# Altium schematic symbol library jlcpcb_2025_04_capacitors_extended_0201.schlib: 1175 symbols (part 2 of 7) (continued)
## C0603X7R471KGT
designator C?  Capacitance: 470pF  (hidden comment: *)
Capacitor, Ceramic (MLCC), 470pF, ±10%, 50V, X7R, ±10%, SMD 0201; Manufacturer: Darfon Elec; Manufacturer Part Number: C0603X7R471KGT; Package Size: 0201; JLCPCB Basic Part: No; JLCPCB Part Number: C258476; Supplier 1: LCSC; Category: Capacitors - MLCC; Supplier Part Number 1: C258476; Tolerance: ±10%; Voltage Rating: 50V; Temperature Coefficient: X7R; RoHS: Yes; ComponentLink1Description: Datasheet; ComponentLink1URL: https://wmsc.lcsc.com/wmsc/upload/file/pdf/v2/lcsc/2304140030_Darfon-Elec-C0603X7R471KGT_C258476.pdf; ComponentLink2Description: JLCPCB Part URL; ComponentLink2URL: https://jlcpcb.com/partdetail/C258476; ComponentLink3Description: LCSC Part URL; ComponentLink3URL: https://lcsc.com/product-detail/Multilayer-Ceramic-Capacitors-MLCC---SMD-SMT_Darfon-Elec-Darfon-Elec-C0603X7R471KGT_C258476.html
footprint CAP-0201 (0201 (0603M) Capacitor)
pins: 1, 2

## C0603X7R472KDTS
designator C?  Capacitance: 4.7nF  (hidden comment: *)
Capacitor, Ceramic (MLCC), 4.7nF, ±10%, 10V, X7R, ±10%, SMD 0201; Manufacturer: Darfon Elec; Manufacturer Part Number: C0603X7R472KDTS; Package Size: 0201; JLCPCB Basic Part: No; JLCPCB Part Number: C258478; Supplier 1: LCSC; Category: Capacitors - MLCC; Supplier Part Number 1: C258478; Tolerance: ±10%; Voltage Rating: 10V; Temperature Coefficient: X7R; RoHS: Yes; ComponentLink1Description: Datasheet; ComponentLink1URL: https://wmsc.lcsc.com/wmsc/upload/file/pdf/v2/lcsc/2304140030_Darfon-Elec-C0603X7R472KDTS_C258478.pdf; ComponentLink2Description: JLCPCB Part URL; ComponentLink2URL: https://jlcpcb.com/partdetail/C258478; ComponentLink3Description: LCSC Part URL; ComponentLink3URL: https://lcsc.com/product-detail/Multilayer-Ceramic-Capacitors-MLCC---SMD-SMT_Darfon-Elec-Darfon-Elec-C0603X7R472KDTS_C258478.html
footprint CAP-0201 (0201 (0603M) Capacitor)
pins: 1, 2

## C0603X7R681KGTS
designator C?  Capacitance: 680pF  (hidden comment: *)
Capacitor, Ceramic (MLCC), 680pF, ±10%, 50V, X7R, ±10%, SMD 0201; Manufacturer: Darfon Elec; Manufacturer Part Number: C0603X7R681KGTS; Package Size: 0201; JLCPCB Basic Part: No; JLCPCB Part Number: C311865; Supplier 1: LCSC; Category: Capacitors - MLCC; Supplier Part Number 1: C311865; Tolerance: ±10%; Voltage Rating: 50V; Temperature Coefficient: X7R; RoHS: Yes; ComponentLink1Description: Datasheet; ComponentLink1URL: https://wmsc.lcsc.com/wmsc/upload/file/pdf/v2/lcsc/2304140030_Darfon-Elec-C0603X7R681KGTS_C311865.pdf; ComponentLink2Description: JLCPCB Part URL; ComponentLink2URL: https://jlcpcb.com/partdetail/C311865; ComponentLink3Description: LCSC Part URL; ComponentLink3URL: https://lcsc.com/product-detail/Multilayer-Ceramic-Capacitors-MLCC---SMD-SMT_Darfon-Elec-Darfon-Elec-C0603X7R681KGTS_C311865.html
footprint CAP-0201 (0201 (0603M) Capacitor)
pins: 1, 2

## C0603X7R682KDTS
designator C?  Capacitance: 6.8nF  (hidden comment: *)
Capacitor, Ceramic (MLCC), 6.8nF, ±10%, 10V, X7R, ±10%, SMD 0201; Manufacturer: Darfon Elec; Manufacturer Part Number: C0603X7R682KDTS; Package Size: 0201; JLCPCB Basic Part: No; JLCPCB Part Number: C311863; Supplier 1: LCSC; Category: Capacitors - MLCC; Supplier Part Number 1: C311863; Tolerance: ±10%; Voltage Rating: 10V; Temperature Coefficient: X7R; RoHS: Yes; ComponentLink1Description: Datasheet; ComponentLink1URL: https://wmsc.lcsc.com/wmsc/upload/file/pdf/v2/lcsc/2304140030_Darfon-Elec-C0603X7R682KDTS_C311863.pdf; ComponentLink2Description: JLCPCB Part URL; ComponentLink2URL: https://jlcpcb.com/partdetail/C311863; ComponentLink3Description: LCSC Part URL; ComponentLink3URL: https://lcsc.com/product-detail/Multilayer-Ceramic-Capacitors-MLCC---SMD-SMT_Darfon-Elec-Darfon-Elec-C0603X7R682KDTS_C311863.html
footprint CAP-0201 (0201 (0603M) Capacitor)
pins: 1, 2

## C0603X7S1A104KT00NE
designator C?  Capacitance: 100nF  (hidden comment: *)
Capacitor, Ceramic (MLCC), 100nF, ±10%, 10V, X7S, ±10%, SMD 0201; Manufacturer: TDK; Manufacturer Part Number: C0603X7S1A104KT00NE; Package Size: 0201; JLCPCB Basic Part: No; JLCPCB Part Number: C445752; Supplier 1: LCSC; Category: Capacitors - MLCC; Supplier Part Number 1: C445752; Tolerance: ±10%; Voltage Rating: 10V; Temperature Coefficient: X7S; RoHS: Yes; ComponentLink1Description: Datasheet; ComponentLink1URL: https://wmsc.lcsc.com/wmsc/upload/file/pdf/v2/lcsc/2304140030_TDK-C0603X7S1A104KT00NE_C445752.pdf; ComponentLink2Description: JLCPCB Part URL; ComponentLink2URL: https://jlcpcb.com/partdetail/C445752; ComponentLink3Description: LCSC Part URL; ComponentLink3URL: https://lcsc.com/product-detail/Multilayer-Ceramic-Capacitors-MLCC---SMD-SMT_TDK-TDK-C0603X7S1A104KT00NE_C445752.html
footprint CAP-0201 (0201 (0603M) Capacitor)
pins: 1, 2

## CC0201BRNPO9BN1R2
designator C?  Capacitance: 1.2pF  (hidden comment: *)
Capacitor, Ceramic (MLCC), 1.2pF, 50V, NP0, SMD 0201; Manufacturer: YAGEO; Manufacturer Part Number: CC0201BRNPO9BN1R2; Package Size: 0201; JLCPCB Basic Part: No; JLCPCB Part Number: C326704; Supplier 1: LCSC; Category: Capacitors - MLCC; Supplier Part Number 1: C326704; Voltage Rating: 50V; Temperature Coefficient: NP0; RoHS: Yes; ComponentLink1Description: Datasheet; ComponentLink1URL: https://wmsc.lcsc.com/wmsc/upload/file/pdf/v2/lcsc/1811151646_YAGEO-CC0201BRNPO9BN1R2_C326704.pdf; ComponentLink2Description: JLCPCB Part URL; ComponentLink2URL: https://jlcpcb.com/partdetail/C326704; ComponentLink3Description: LCSC Part URL; ComponentLink3URL: https://lcsc.com/product-detail/Multilayer-Ceramic-Capacitors-MLCC---SMD-SMT_YAGEO-YAGEO-CC0201BRNPO9BN1R2_C326704.html
footprint CAP-0201 (0201 (0603M) Capacitor)
pins: 1, 2

## CC0201BRNPO9BN1R4
designator C?  Capacitance: 1.4pF  (hidden comment: *)
Capacitor, Ceramic (MLCC), 1.4pF, 50V, NP0, SMD 0201; Manufacturer: YAGEO; Manufacturer Part Number: CC0201BRNPO9BN1R4; Package Size: 0201; JLCPCB Basic Part: No; JLCPCB Part Number: C2930547; Supplier 1: LCSC; Category: Capacitors - MLCC; Supplier Part Number 1: C2930547; Voltage Rating: 50V; Temperature Coefficient: NP0; RoHS: Yes; ComponentLink1Description: Datasheet; ComponentLink1URL: https://wmsc.lcsc.com/wmsc/upload/file/pdf/v2/lcsc/2201121500_YAGEO-CC0201BRNPO9BN1R4_C2930547.pdf; ComponentLink2Description: JLCPCB Part URL; ComponentLink2URL: https://jlcpcb.com/partdetail/C2930547; ComponentLink3Description: LCSC Part URL; ComponentLink3URL: https://lcsc.com/product-detail/Multilayer-Ceramic-Capacitors-MLCC---SMD-SMT_YAGEO-YAGEO-CC0201BRNPO9BN1R4_C2930547.html
footprint CAP-0201 (0201 (0603M) Capacitor)
pins: 1, 2

## CC0201BRNPO9BN2R0
designator C?  Capacitance: 2pF  (hidden comment: *)
Capacitor, Ceramic (MLCC), 2pF, 50V, NP0, SMD 0201; Manufacturer: YAGEO; Manufacturer Part Number: CC0201BRNPO9BN2R0; Package Size: 0201; JLCPCB Basic Part: No; JLCPCB Part Number: C505489; Supplier 1: LCSC; Category: Capacitors - MLCC; Supplier Part Number 1: C505489; Voltage Rating: 50V; Temperature Coefficient: NP0; RoHS: Yes; ComponentLink1Description: Datasheet; ComponentLink1URL: https://wmsc.lcsc.com/wmsc/upload/file/pdf/v2/lcsc/2304140030_YAGEO-CC0201BRNPO9BN2R0_C505489.pdf; ComponentLink2Description: JLCPCB Part URL; ComponentLink2URL: https://jlcpcb.com/partdetail/C505489; ComponentLink3Description: LCSC Part URL; ComponentLink3URL: https://lcsc.com/product-detail/Multilayer-Ceramic-Capacitors-MLCC---SMD-SMT_YAGEO-YAGEO-CC0201BRNPO9BN2R0_C505489.html
footprint CAP-0201 (0201 (0603M) Capacitor)
pins: 1, 2

## CC0201BRNPO9BN2R4
designator C?  Capacitance: 2.4pF  (hidden comment: *)
Capacitor, Ceramic (MLCC), 2.4pF, 50V, NP0, SMD 0201; Manufacturer: YAGEO; Manufacturer Part Number: CC0201BRNPO9BN2R4; Package Size: 0201; JLCPCB Basic Part: No; JLCPCB Part Number: C576676; Supplier 1: LCSC; Category: Capacitors - MLCC; Supplier Part Number 1: C576676; Voltage Rating: 50V; Temperature Coefficient: NP0; RoHS: Yes; ComponentLink1Description: Datasheet; ComponentLink1URL: https://wmsc.lcsc.com/wmsc/upload/file/pdf/v2/lcsc/2201131030_YAGEO-CC0201BRNPO9BN2R4_C576676.pdf; ComponentLink2Description: JLCPCB Part URL; ComponentLink2URL: https://jlcpcb.com/partdetail/C576676; ComponentLink3Description: LCSC Part URL; ComponentLink3URL: https://lcsc.com/product-detail/Multilayer-Ceramic-Capacitors-MLCC---SMD-SMT_YAGEO-YAGEO-CC0201BRNPO9BN2R4_C576676.html
footprint CAP-0201 (0201 (0603M) Capacitor)
pins: 1, 2

## CC0201BRNPO9BN2R7
designator C?  Capacitance: 2.7pF  (hidden comment: *)
Capacitor, Ceramic (MLCC), 2.7pF, 50V, NP0, SMD 0201; Manufacturer: YAGEO; Manufacturer Part Number: CC0201BRNPO9BN2R7; Package Size: 0201; JLCPCB Basic Part: No; JLCPCB Part Number: C505475; Supplier 1: LCSC; Category: Capacitors - MLCC; Supplier Part Number 1: C505475; Voltage Rating: 50V; Temperature Coefficient: NP0; RoHS: Yes; ComponentLink1Description: Datasheet; ComponentLink1URL: https://wmsc.lcsc.com/wmsc/upload/file/pdf/v2/lcsc/2304140030_YAGEO-CC0201BRNPO9BN2R7_C505475.pdf; ComponentLink2Description: JLCPCB Part URL; ComponentLink2URL: https://jlcpcb.com/partdetail/C505475; ComponentLink3Description: LCSC Part URL; ComponentLink3URL: https://lcsc.com/product-detail/Multilayer-Ceramic-Capacitors-MLCC---SMD-SMT_YAGEO-YAGEO-CC0201BRNPO9BN2R7_C505475.html
footprint CAP-0201 (0201 (0603M) Capacitor)
pins: 1, 2

## CC0201BRNPO9BN3R3
designator C?  Capacitance: 3.3pF  (hidden comment: *)
Capacitor, Ceramic (MLCC), 3.3pF, 50V, NP0, SMD 0201; Manufacturer: YAGEO; Manufacturer Part Number: CC0201BRNPO9BN3R3; Package Size: 0201; JLCPCB Basic Part: No; JLCPCB Part Number: C505487; Supplier 1: LCSC; Category: Capacitors - MLCC; Supplier Part Number 1: C505487; Voltage Rating: 50V; Temperature Coefficient: NP0; RoHS: Yes; ComponentLink1Description: Datasheet; ComponentLink1URL: https://wmsc.lcsc.com/wmsc/upload/file/pdf/v2/lcsc/2304140030_YAGEO-CC0201BRNPO9BN3R3_C505487.pdf; ComponentLink2Description: JLCPCB Part URL; ComponentLink2URL: https://jlcpcb.com/partdetail/C505487; ComponentLink3Description: LCSC Part URL; ComponentLink3URL: https://lcsc.com/product-detail/Multilayer-Ceramic-Capacitors-MLCC---SMD-SMT_YAGEO-YAGEO-CC0201BRNPO9BN3R3_C505487.html
footprint CAP-0201 (0201 (0603M) Capacitor)
pins: 1, 2

## CC0201BRNPO9BN3R6
designator C?  Capacitance: 3.6pF  (hidden comment: *)
Capacitor, Ceramic (MLCC), 3.6pF, 50V, NP0, SMD 0201; Manufacturer: YAGEO; Manufacturer Part Number: CC0201BRNPO9BN3R6; Package Size: 0201; JLCPCB Basic Part: No; JLCPCB Part Number: C576677; Supplier 1: LCSC; Category: Capacitors - MLCC; Supplier Part Number 1: C576677; Voltage Rating: 50V; Temperature Coefficient: NP0; RoHS: Yes; ComponentLink1Description: Datasheet; ComponentLink1URL: https://wmsc.lcsc.com/wmsc/upload/file/pdf/v2/lcsc/2009261808_YAGEO-CC0201BRNPO9BN3R6_C576677.pdf; ComponentLink2Description: JLCPCB Part URL; ComponentLink2URL: https://jlcpcb.com/partdetail/C576677; ComponentLink3Description: LCSC Part URL; ComponentLink3URL: https://lcsc.com/product-detail/Multilayer-Ceramic-Capacitors-MLCC---SMD-SMT_YAGEO-YAGEO-CC0201BRNPO9BN3R6_C576677.html
footprint CAP-0201 (0201 (0603M) Capacitor)
pins: 1, 2

## CC0201BRNPO9BN3R9
designator C?  Capacitance: 3.9pF  (hidden comment: *)
Capacitor, Ceramic (MLCC), 3.9pF, 50V, NP0, SMD 0201; Manufacturer: YAGEO; Manufacturer Part Number: CC0201BRNPO9BN3R9; Package Size: 0201; JLCPCB Basic Part: No; JLCPCB Part Number: C505485; Supplier 1: LCSC; Category: Capacitors - MLCC; Supplier Part Number 1: C505485; Voltage Rating: 50V; Temperature Coefficient: NP0; RoHS: Yes; ComponentLink1Description: Datasheet; ComponentLink1URL: https://wmsc.lcsc.com/wmsc/upload/file/pdf/v2/lcsc/2304140030_YAGEO-CC0201BRNPO9BN3R9_C505485.pdf; ComponentLink2Description: JLCPCB Part URL; ComponentLink2URL: https://jlcpcb.com/partdetail/C505485; ComponentLink3Description: LCSC Part URL; ComponentLink3URL: https://lcsc.com/product-detail/Multilayer-Ceramic-Capacitors-MLCC---SMD-SMT_YAGEO-YAGEO-CC0201BRNPO9BN3R9_C505485.html
footprint CAP-0201 (0201 (0603M) Capacitor)
pins: 1, 2

## CC0201BRNPO9BN4R7
designator C?  Capacitance: 4.7pF  (hidden comment: *)
Capacitor, Ceramic (MLCC), 4.7pF, 50V, NP0, SMD 0201; Manufacturer: YAGEO; Manufacturer Part Number: CC0201BRNPO9BN4R7; Package Size: 0201; JLCPCB Basic Part: No; JLCPCB Part Number: C505471; Supplier 1: LCSC; Category: Capacitors - MLCC; Supplier Part Number 1: C505471; Voltage Rating: 50V; Temperature Coefficient: NP0; RoHS: Yes; ComponentLink1Description: Datasheet; ComponentLink1URL: https://wmsc.lcsc.com/wmsc/upload/file/pdf/v2/lcsc/2304140030_YAGEO-CC0201BRNPO9BN4R7_C505471.pdf; ComponentLink2Description: JLCPCB Part URL; ComponentLink2URL: https://jlcpcb.com/partdetail/C505471; ComponentLink3Description: LCSC Part URL; ComponentLink3URL: https://lcsc.com/product-detail/Multilayer-Ceramic-Capacitors-MLCC---SMD-SMT_YAGEO-YAGEO-CC0201BRNPO9BN4R7_C505471.html
footprint CAP-0201 (0201 (0603M) Capacitor)
pins: 1, 2

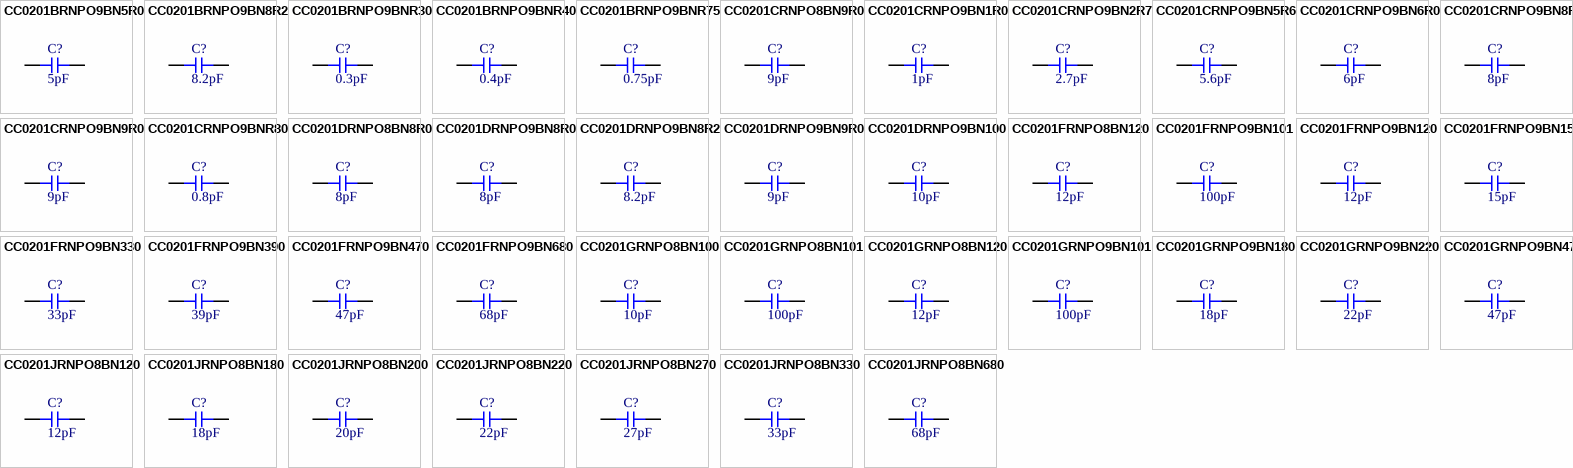
[diagram p6: symbols CC0201BRNPO9BN5R0 to CC0201JRNPO8BN680]

## CC0201BRNPO9BN5R0
designator C?  Capacitance: 5pF  (hidden comment: *)
Capacitor, Ceramic (MLCC), 5pF, 50V, NP0, SMD 0201; Manufacturer: YAGEO; Manufacturer Part Number: CC0201BRNPO9BN5R0; Package Size: 0201; JLCPCB Basic Part: No; JLCPCB Part Number: C576680; Supplier 1: LCSC; Category: Capacitors - MLCC; Supplier Part Number 1: C576680; Voltage Rating: 50V; Temperature Coefficient: NP0; RoHS: Yes; ComponentLink1Description: Datasheet; ComponentLink1URL: https://wmsc.lcsc.com/wmsc/upload/file/pdf/v2/lcsc/2203081130_YAGEO-CC0201BRNPO9BN5R0_C576680.pdf; ComponentLink2Description: JLCPCB Part URL; ComponentLink2URL: https://jlcpcb.com/partdetail/C576680; ComponentLink3Description: LCSC Part URL; ComponentLink3URL: https://lcsc.com/product-detail/Multilayer-Ceramic-Capacitors-MLCC---SMD-SMT_YAGEO-YAGEO-CC0201BRNPO9BN5R0_C576680.html
footprint CAP-0201 (0201 (0603M) Capacitor)
pins: 1, 2

## CC0201BRNPO9BN8R2
designator C?  Capacitance: 8.2pF  (hidden comment: *)
Capacitor, Ceramic (MLCC), 8.2pF, 50V, NP0, SMD 0201; Manufacturer: YAGEO; Manufacturer Part Number: CC0201BRNPO9BN8R2; Package Size: 0201; JLCPCB Basic Part: No; JLCPCB Part Number: C505501; Supplier 1: LCSC; Category: Capacitors - MLCC; Supplier Part Number 1: C505501; Voltage Rating: 50V; Temperature Coefficient: NP0; RoHS: Yes; ComponentLink1Description: Datasheet; ComponentLink1URL: https://wmsc.lcsc.com/wmsc/upload/file/pdf/v2/lcsc/2304140030_YAGEO-CC0201BRNPO9BN8R2_C505501.pdf; ComponentLink2Description: JLCPCB Part URL; ComponentLink2URL: https://jlcpcb.com/partdetail/C505501; ComponentLink3Description: LCSC Part URL; ComponentLink3URL: https://lcsc.com/product-detail/Multilayer-Ceramic-Capacitors-MLCC---SMD-SMT_YAGEO-YAGEO-CC0201BRNPO9BN8R2_C505501.html
footprint CAP-0201 (0201 (0603M) Capacitor)
pins: 1, 2

## CC0201BRNPO9BNR30
designator C?  Capacitance: 0.3pF  (hidden comment: *)
Capacitor, Ceramic (MLCC), 0.3pF, 50V, NP0, SMD 0201; Manufacturer: YAGEO; Manufacturer Part Number: CC0201BRNPO9BNR30; Package Size: 0201; JLCPCB Basic Part: No; JLCPCB Part Number: C309450; Supplier 1: LCSC; Category: Capacitors - MLCC; Supplier Part Number 1: C309450; Voltage Rating: 50V; Temperature Coefficient: NP0; RoHS: Yes; ComponentLink1Description: Datasheet; ComponentLink1URL: https://wmsc.lcsc.com/wmsc/upload/file/pdf/v2/lcsc/2304140030_YAGEO-CC0201BRNPO9BNR30_C309450.pdf; ComponentLink2Description: JLCPCB Part URL; ComponentLink2URL: https://jlcpcb.com/partdetail/C309450; ComponentLink3Description: LCSC Part URL; ComponentLink3URL: https://lcsc.com/product-detail/Multilayer-Ceramic-Capacitors-MLCC---SMD-SMT_YAGEO-YAGEO-CC0201BRNPO9BNR30_C309450.html
footprint CAP-0201 (0201 (0603M) Capacitor)
pins: 1, 2

## CC0201BRNPO9BNR40
designator C?  Capacitance: 0.4pF  (hidden comment: *)
Capacitor, Ceramic (MLCC), 0.4pF, 50V, NP0, SMD 0201; Manufacturer: YAGEO; Manufacturer Part Number: CC0201BRNPO9BNR40; Package Size: 0201; JLCPCB Basic Part: No; JLCPCB Part Number: C576683; Supplier 1: LCSC; Category: Capacitors - MLCC; Supplier Part Number 1: C576683; Voltage Rating: 50V; Temperature Coefficient: NP0; RoHS: Yes; ComponentLink1Description: Datasheet; ComponentLink1URL: https://wmsc.lcsc.com/wmsc/upload/file/pdf/v2/lcsc/2112151830_YAGEO-CC0201BRNPO9BNR40_C576683.pdf; ComponentLink2Description: JLCPCB Part URL; ComponentLink2URL: https://jlcpcb.com/partdetail/C576683; ComponentLink3Description: LCSC Part URL; ComponentLink3URL: https://lcsc.com/product-detail/Multilayer-Ceramic-Capacitors-MLCC---SMD-SMT_YAGEO-YAGEO-CC0201BRNPO9BNR40_C576683.html
footprint CAP-0201 (0201 (0603M) Capacitor)
pins: 1, 2

## CC0201BRNPO9BNR75
designator C?  Capacitance: 0.75pF  (hidden comment: *)
Capacitor, Ceramic (MLCC), 0.75pF, 50V, NP0, SMD 0201; Manufacturer: YAGEO; Manufacturer Part Number: CC0201BRNPO9BNR75; Package Size: 0201; JLCPCB Basic Part: No; JLCPCB Part Number: C505469; Supplier 1: LCSC; Category: Capacitors - MLCC; Supplier Part Number 1: C505469; Voltage Rating: 50V; Temperature Coefficient: NP0; RoHS: Yes; ComponentLink1Description: Datasheet; ComponentLink1URL: https://wmsc.lcsc.com/wmsc/upload/file/pdf/v2/lcsc/2304140030_YAGEO-CC0201BRNPO9BNR75_C505469.pdf; ComponentLink2Description: JLCPCB Part URL; ComponentLink2URL: https://jlcpcb.com/partdetail/C505469; ComponentLink3Description: LCSC Part URL; ComponentLink3URL: https://lcsc.com/product-detail/Multilayer-Ceramic-Capacitors-MLCC---SMD-SMT_YAGEO-YAGEO-CC0201BRNPO9BNR75_C505469.html
footprint CAP-0201 (0201 (0603M) Capacitor)
pins: 1, 2

## CC0201CRNPO8BN9R0
designator C?  Capacitance: 9pF  (hidden comment: *)
Capacitor, Ceramic (MLCC), 9pF, 25V, NP0, SMD 0201; Manufacturer: YAGEO; Manufacturer Part Number: CC0201CRNPO8BN9R0; Package Size: 0201; JLCPCB Basic Part: No; JLCPCB Part Number: C1852874; Supplier 1: LCSC; Category: Capacitors - MLCC; Supplier Part Number 1: C1852874; Voltage Rating: 25V; Temperature Coefficient: NP0; RoHS: Yes; ComponentLink1Description: Datasheet; ComponentLink1URL: https://wmsc.lcsc.com/wmsc/upload/file/pdf/v2/lcsc/2202151130_YAGEO-CC0201CRNPO8BN9R0_C1852874.pdf; ComponentLink2Description: JLCPCB Part URL; ComponentLink2URL: https://jlcpcb.com/partdetail/C1852874; ComponentLink3Description: LCSC Part URL; ComponentLink3URL: https://lcsc.com/product-detail/Multilayer-Ceramic-Capacitors-MLCC---SMD-SMT_YAGEO-YAGEO-CC0201CRNPO8BN9R0_C1852874.html
footprint CAP-0201 (0201 (0603M) Capacitor)
pins: 1, 2

## CC0201CRNPO9BN1R0
designator C?  Capacitance: 1pF  (hidden comment: *)
Capacitor, Ceramic (MLCC), 1pF, 50V, NP0, SMD 0201; Manufacturer: YAGEO; Manufacturer Part Number: CC0201CRNPO9BN1R0; Package Size: 0201; JLCPCB Basic Part: No; JLCPCB Part Number: C277491; Supplier 1: LCSC; Category: Capacitors - MLCC; Supplier Part Number 1: C277491; Voltage Rating: 50V; Temperature Coefficient: NP0; RoHS: Yes; ComponentLink1Description: Datasheet; ComponentLink1URL: https://wmsc.lcsc.com/wmsc/upload/file/pdf/v2/lcsc/2304140030_YAGEO-CC0201CRNPO9BN1R0_C277491.pdf; ComponentLink2Description: JLCPCB Part URL; ComponentLink2URL: https://jlcpcb.com/partdetail/C277491; ComponentLink3Description: LCSC Part URL; ComponentLink3URL: https://lcsc.com/product-detail/Multilayer-Ceramic-Capacitors-MLCC---SMD-SMT_YAGEO-YAGEO-CC0201CRNPO9BN1R0_C277491.html
footprint CAP-0201 (0201 (0603M) Capacitor)
pins: 1, 2

## CC0201CRNPO9BN2R7
designator C?  Capacitance: 2.7pF  (hidden comment: *)
Capacitor, Ceramic (MLCC), 2.7pF, 50V, NP0, SMD 0201; Manufacturer: YAGEO; Manufacturer Part Number: CC0201CRNPO9BN2R7; Package Size: 0201; JLCPCB Basic Part: No; JLCPCB Part Number: C325439; Supplier 1: LCSC; Category: Capacitors - MLCC; Supplier Part Number 1: C325439; Voltage Rating: 50V; Temperature Coefficient: NP0; RoHS: Yes; ComponentLink1Description: Datasheet; ComponentLink1URL: https://wmsc.lcsc.com/wmsc/upload/file/pdf/v2/lcsc/1811031142_YAGEO-CC0201CRNPO9BN2R7_C325439.pdf; ComponentLink2Description: JLCPCB Part URL; ComponentLink2URL: https://jlcpcb.com/partdetail/C325439; ComponentLink3Description: LCSC Part URL; ComponentLink3URL: https://lcsc.com/product-detail/Multilayer-Ceramic-Capacitors-MLCC---SMD-SMT_YAGEO-YAGEO-CC0201CRNPO9BN2R7_C325439.html
footprint CAP-0201 (0201 (0603M) Capacitor)
pins: 1, 2

## CC0201CRNPO9BN5R6
designator C?  Capacitance: 5.6pF  (hidden comment: *)
Capacitor, Ceramic (MLCC), 5.6pF, 50V, NP0, SMD 0201; Manufacturer: YAGEO; Manufacturer Part Number: CC0201CRNPO9BN5R6; Package Size: 0201; JLCPCB Basic Part: No; JLCPCB Part Number: C277492; Supplier 1: LCSC; Category: Capacitors - MLCC; Supplier Part Number 1: C277492; Voltage Rating: 50V; Temperature Coefficient: NP0; RoHS: Yes; ComponentLink1Description: Datasheet; ComponentLink1URL: https://wmsc.lcsc.com/wmsc/upload/file/pdf/v2/lcsc/2304140030_YAGEO-CC0201CRNPO9BN5R6_C277492.pdf; ComponentLink2Description: JLCPCB Part URL; ComponentLink2URL: https://jlcpcb.com/partdetail/C277492; ComponentLink3Description: LCSC Part URL; ComponentLink3URL: https://lcsc.com/product-detail/Multilayer-Ceramic-Capacitors-MLCC---SMD-SMT_YAGEO-YAGEO-CC0201CRNPO9BN5R6_C277492.html
footprint CAP-0201 (0201 (0603M) Capacitor)
pins: 1, 2

## CC0201CRNPO9BN6R0
designator C?  Capacitance: 6pF  (hidden comment: *)
Capacitor, Ceramic (MLCC), 6pF, 50V, NP0, SMD 0201; Manufacturer: YAGEO; Manufacturer Part Number: CC0201CRNPO9BN6R0; Package Size: 0201; JLCPCB Basic Part: No; JLCPCB Part Number: C541190; Supplier 1: LCSC; Category: Capacitors - MLCC; Supplier Part Number 1: C541190; Voltage Rating: 50V; Temperature Coefficient: NP0; RoHS: Yes; ComponentLink1Description: Datasheet; ComponentLink1URL: https://wmsc.lcsc.com/wmsc/upload/file/pdf/v2/lcsc/2006151108_YAGEO-CC0201CRNPO9BN6R0_C541190.pdf; ComponentLink2Description: JLCPCB Part URL; ComponentLink2URL: https://jlcpcb.com/partdetail/C541190; ComponentLink3Description: LCSC Part URL; ComponentLink3URL: https://lcsc.com/product-detail/Multilayer-Ceramic-Capacitors-MLCC---SMD-SMT_YAGEO-YAGEO-CC0201CRNPO9BN6R0_C541190.html
footprint CAP-0201 (0201 (0603M) Capacitor)
pins: 1, 2

## CC0201CRNPO9BN8R0
designator C?  Capacitance: 8pF  (hidden comment: *)
Capacitor, Ceramic (MLCC), 8pF, 50V, NP0, SMD 0201; Manufacturer: YAGEO; Manufacturer Part Number: CC0201CRNPO9BN8R0; Package Size: 0201; JLCPCB Basic Part: No; JLCPCB Part Number: C277489; Supplier 1: LCSC; Category: Capacitors - MLCC; Supplier Part Number 1: C277489; Voltage Rating: 50V; Temperature Coefficient: NP0; RoHS: Yes; ComponentLink1Description: Datasheet; ComponentLink1URL: https://wmsc.lcsc.com/wmsc/upload/file/pdf/v2/lcsc/2304140030_YAGEO-CC0201CRNPO9BN8R0_C277489.pdf; ComponentLink2Description: JLCPCB Part URL; ComponentLink2URL: https://jlcpcb.com/partdetail/C277489; ComponentLink3Description: LCSC Part URL; ComponentLink3URL: https://lcsc.com/product-detail/Multilayer-Ceramic-Capacitors-MLCC---SMD-SMT_YAGEO-YAGEO-CC0201CRNPO9BN8R0_C277489.html
footprint CAP-0201 (0201 (0603M) Capacitor)
pins: 1, 2

## CC0201CRNPO9BN9R0
designator C?  Capacitance: 9pF  (hidden comment: *)
Capacitor, Ceramic (MLCC), 9pF, 50V, NP0, SMD 0201; Manufacturer: YAGEO; Manufacturer Part Number: CC0201CRNPO9BN9R0; Package Size: 0201; JLCPCB Basic Part: No; JLCPCB Part Number: C277498; Supplier 1: LCSC; Category: Capacitors - MLCC; Supplier Part Number 1: C277498; Voltage Rating: 50V; Temperature Coefficient: NP0; RoHS: Yes; ComponentLink1Description: Datasheet; ComponentLink1URL: https://wmsc.lcsc.com/wmsc/upload/file/pdf/v2/lcsc/2304140030_YAGEO-CC0201CRNPO9BN9R0_C277498.pdf; ComponentLink2Description: JLCPCB Part URL; ComponentLink2URL: https://jlcpcb.com/partdetail/C277498; ComponentLink3Description: LCSC Part URL; ComponentLink3URL: https://lcsc.com/product-detail/Multilayer-Ceramic-Capacitors-MLCC---SMD-SMT_YAGEO-YAGEO-CC0201CRNPO9BN9R0_C277498.html
footprint CAP-0201 (0201 (0603M) Capacitor)
pins: 1, 2

## CC0201CRNPO9BNR80
designator C?  Capacitance: 0.8pF  (hidden comment: *)
Capacitor, Ceramic (MLCC), 0.8pF, 50V, NP0, SMD 0201; Manufacturer: YAGEO; Manufacturer Part Number: CC0201CRNPO9BNR80; Package Size: 0201; JLCPCB Basic Part: No; JLCPCB Part Number: C327151; Supplier 1: LCSC; Category: Capacitors - MLCC; Supplier Part Number 1: C327151; Voltage Rating: 50V; Temperature Coefficient: NP0; RoHS: Yes; ComponentLink1Description: Datasheet; ComponentLink1URL: https://wmsc.lcsc.com/wmsc/upload/file/pdf/v2/lcsc/1811061230_YAGEO-CC0201CRNPO9BNR80_C327151.pdf; ComponentLink2Description: JLCPCB Part URL; ComponentLink2URL: https://jlcpcb.com/partdetail/C327151; ComponentLink3Description: LCSC Part URL; ComponentLink3URL: https://lcsc.com/product-detail/Multilayer-Ceramic-Capacitors-MLCC---SMD-SMT_YAGEO-YAGEO-CC0201CRNPO9BNR80_C327151.html
footprint CAP-0201 (0201 (0603M) Capacitor)
pins: 1, 2

## CC0201DRNPO8BN8R0
designator C?  Capacitance: 8pF  (hidden comment: *)
Capacitor, Ceramic (MLCC), 8pF, 25V, NP0, SMD 0201; Manufacturer: YAGEO; Manufacturer Part Number: CC0201DRNPO8BN8R0; Package Size: 0201; JLCPCB Basic Part: No; JLCPCB Part Number: C526925; Supplier 1: LCSC; Category: Capacitors - MLCC; Supplier Part Number 1: C526925; Voltage Rating: 25V; Temperature Coefficient: NP0; RoHS: Yes; ComponentLink1Description: Datasheet; ComponentLink1URL: https://wmsc.lcsc.com/wmsc/upload/file/pdf/v2/lcsc/2005261832_YAGEO-CC0201DRNPO8BN8R0_C526925.pdf; ComponentLink2Description: JLCPCB Part URL; ComponentLink2URL: https://jlcpcb.com/partdetail/C526925; ComponentLink3Description: LCSC Part URL; ComponentLink3URL: https://lcsc.com/product-detail/Multilayer-Ceramic-Capacitors-MLCC---SMD-SMT_YAGEO-YAGEO-CC0201DRNPO8BN8R0_C526925.html
footprint CAP-0201 (0201 (0603M) Capacitor)
pins: 1, 2

## CC0201DRNPO9BN8R0
designator C?  Capacitance: 8pF  (hidden comment: *)
Capacitor, Ceramic (MLCC), 8pF, 50V, NP0, SMD 0201; Manufacturer: YAGEO; Manufacturer Part Number: CC0201DRNPO9BN8R0; Package Size: 0201; JLCPCB Basic Part: No; JLCPCB Part Number: C541200; Supplier 1: LCSC; Category: Capacitors - MLCC; Supplier Part Number 1: C541200; Voltage Rating: 50V; Temperature Coefficient: NP0; RoHS: Yes; ComponentLink1Description: Datasheet; ComponentLink1URL: https://wmsc.lcsc.com/wmsc/upload/file/pdf/v2/lcsc/2006151109_YAGEO-CC0201DRNPO9BN8R0_C541200.pdf; ComponentLink2Description: JLCPCB Part URL; ComponentLink2URL: https://jlcpcb.com/partdetail/C541200; ComponentLink3Description: LCSC Part URL; ComponentLink3URL: https://lcsc.com/product-detail/Multilayer-Ceramic-Capacitors-MLCC---SMD-SMT_YAGEO-YAGEO-CC0201DRNPO9BN8R0_C541200.html
footprint CAP-0201 (0201 (0603M) Capacitor)
pins: 1, 2

## CC0201DRNPO9BN8R2
designator C?  Capacitance: 8.2pF  (hidden comment: *)
Capacitor, Ceramic (MLCC), 8.2pF, 50V, NP0, SMD 0201; Manufacturer: YAGEO; Manufacturer Part Number: CC0201DRNPO9BN8R2; Package Size: 0201; JLCPCB Basic Part: No; JLCPCB Part Number: C325443; Supplier 1: LCSC; Category: Capacitors - MLCC; Supplier Part Number 1: C325443; Voltage Rating: 50V; Temperature Coefficient: NP0; RoHS: Yes; ComponentLink1Description: Datasheet; ComponentLink1URL: https://wmsc.lcsc.com/wmsc/upload/file/pdf/v2/lcsc/1811031142_YAGEO-CC0201DRNPO9BN8R2_C325443.pdf; ComponentLink2Description: JLCPCB Part URL; ComponentLink2URL: https://jlcpcb.com/partdetail/C325443; ComponentLink3Description: LCSC Part URL; ComponentLink3URL: https://lcsc.com/product-detail/Multilayer-Ceramic-Capacitors-MLCC---SMD-SMT_YAGEO-YAGEO-CC0201DRNPO9BN8R2_C325443.html
footprint CAP-0201 (0201 (0603M) Capacitor)
pins: 1, 2

## CC0201DRNPO9BN9R0
designator C?  Capacitance: 9pF  (hidden comment: *)
Capacitor, Ceramic (MLCC), 9pF, 50V, NP0, SMD 0201; Manufacturer: YAGEO; Manufacturer Part Number: CC0201DRNPO9BN9R0; Package Size: 0201; JLCPCB Basic Part: No; JLCPCB Part Number: C541201; Supplier 1: LCSC; Category: Capacitors - MLCC; Supplier Part Number 1: C541201; Voltage Rating: 50V; Temperature Coefficient: NP0; RoHS: Yes; ComponentLink1Description: Datasheet; ComponentLink1URL: https://wmsc.lcsc.com/wmsc/upload/file/pdf/v2/lcsc/2006151109_YAGEO-CC0201DRNPO9BN9R0_C541201.pdf; ComponentLink2Description: JLCPCB Part URL; ComponentLink2URL: https://jlcpcb.com/partdetail/C541201; ComponentLink3Description: LCSC Part URL; ComponentLink3URL: https://lcsc.com/product-detail/Multilayer-Ceramic-Capacitors-MLCC---SMD-SMT_YAGEO-YAGEO-CC0201DRNPO9BN9R0_C541201.html
footprint CAP-0201 (0201 (0603M) Capacitor)
pins: 1, 2

## CC0201DRNPO9BN100
designator C?  Capacitance: 10pF  (hidden comment: *)
Capacitor, Ceramic (MLCC), 10pF, 50V, NP0, SMD 0201; Manufacturer: YAGEO; Manufacturer Part Number: CC0201DRNPO9BN100; Package Size: 0201; JLCPCB Basic Part: No; JLCPCB Part Number: C576689; Supplier 1: LCSC; Category: Capacitors - MLCC; Supplier Part Number 1: C576689; Voltage Rating: 50V; Temperature Coefficient: NP0; RoHS: Yes; ComponentLink1Description: Datasheet; ComponentLink1URL: https://wmsc.lcsc.com/wmsc/upload/file/pdf/v2/lcsc/2008201234_YAGEO-CC0201DRNPO9BN100_C576689.pdf; ComponentLink2Description: JLCPCB Part URL; ComponentLink2URL: https://jlcpcb.com/partdetail/C576689; ComponentLink3Description: LCSC Part URL; ComponentLink3URL: https://lcsc.com/product-detail/Multilayer-Ceramic-Capacitors-MLCC---SMD-SMT_YAGEO-YAGEO-CC0201DRNPO9BN100_C576689.html
footprint CAP-0201 (0201 (0603M) Capacitor)
pins: 1, 2

## CC0201FRNPO8BN120
designator C?  Capacitance: 12pF  (hidden comment: *)
Capacitor, Ceramic (MLCC), 12pF, ±1%, 25V, NP0, ±1%, SMD 0201; Manufacturer: YAGEO; Manufacturer Part Number: CC0201FRNPO8BN120; Package Size: 0201; JLCPCB Basic Part: No; JLCPCB Part Number: C541254; Supplier 1: LCSC; Category: Capacitors - MLCC; Supplier Part Number 1: C541254; Tolerance: ±1%; Voltage Rating: 25V; Temperature Coefficient: NP0; RoHS: Yes; ComponentLink1Description: Datasheet; ComponentLink1URL: https://wmsc.lcsc.com/wmsc/upload/file/pdf/v2/lcsc/2006151110_YAGEO-CC0201FRNPO8BN120_C541254.pdf; ComponentLink2Description: JLCPCB Part URL; ComponentLink2URL: https://jlcpcb.com/partdetail/C541254; ComponentLink3Description: LCSC Part URL; ComponentLink3URL: https://lcsc.com/product-detail/Multilayer-Ceramic-Capacitors-MLCC---SMD-SMT_YAGEO-YAGEO-CC0201FRNPO8BN120_C541254.html
footprint CAP-0201 (0201 (0603M) Capacitor)
pins: 1, 2

## CC0201FRNPO9BN101
designator C?  Capacitance: 100pF  (hidden comment: *)
Capacitor, Ceramic (MLCC), 100pF, 50V, NP0, SMD 0201; Manufacturer: YAGEO; Manufacturer Part Number: CC0201FRNPO9BN101; Package Size: 0201; JLCPCB Basic Part: No; JLCPCB Part Number: C541258; Supplier 1: LCSC; Category: Capacitors - MLCC; Supplier Part Number 1: C541258; Voltage Rating: 50V; Temperature Coefficient: NP0; RoHS: Yes; ComponentLink1Description: Datasheet; ComponentLink1URL: https://wmsc.lcsc.com/wmsc/upload/file/pdf/v2/lcsc/2006151110_YAGEO-CC0201FRNPO9BN101_C541258.pdf; ComponentLink2Description: JLCPCB Part URL; ComponentLink2URL: https://jlcpcb.com/partdetail/C541258; ComponentLink3Description: LCSC Part URL; ComponentLink3URL: https://lcsc.com/product-detail/Multilayer-Ceramic-Capacitors-MLCC---SMD-SMT_YAGEO-YAGEO-CC0201FRNPO9BN101_C541258.html
footprint CAP-0201 (0201 (0603M) Capacitor)
pins: 1, 2

## CC0201FRNPO9BN120
designator C?  Capacitance: 12pF  (hidden comment: *)
Capacitor, Ceramic (MLCC), 12pF, ±1%, 50V, NP0, ±1%, SMD 0201; Manufacturer: YAGEO; Manufacturer Part Number: CC0201FRNPO9BN120; Package Size: 0201; JLCPCB Basic Part: No; JLCPCB Part Number: C526929; Supplier 1: LCSC; Category: Capacitors - MLCC; Supplier Part Number 1: C526929; Tolerance: ±1%; Voltage Rating: 50V; Temperature Coefficient: NP0; RoHS: Yes; ComponentLink1Description: Datasheet; ComponentLink1URL: https://wmsc.lcsc.com/wmsc/upload/file/pdf/v2/lcsc/2006070932_YAGEO-CC0201FRNPO9BN120_C526929.pdf; ComponentLink2Description: JLCPCB Part URL; ComponentLink2URL: https://jlcpcb.com/partdetail/C526929; ComponentLink3Description: LCSC Part URL; ComponentLink3URL: https://lcsc.com/product-detail/Multilayer-Ceramic-Capacitors-MLCC---SMD-SMT_YAGEO-YAGEO-CC0201FRNPO9BN120_C526929.html
footprint CAP-0201 (0201 (0603M) Capacitor)
pins: 1, 2

## CC0201FRNPO9BN150
designator C?  Capacitance: 15pF  (hidden comment: *)
Capacitor, Ceramic (MLCC), 15pF, 50V, NP0, SMD 0201; Manufacturer: YAGEO; Manufacturer Part Number: CC0201FRNPO9BN150; Package Size: 0201; JLCPCB Basic Part: No; JLCPCB Part Number: C541259; Supplier 1: LCSC; Category: Capacitors - MLCC; Supplier Part Number 1: C541259; Voltage Rating: 50V; Temperature Coefficient: NP0; RoHS: Yes; ComponentLink1Description: Datasheet; ComponentLink1URL: https://wmsc.lcsc.com/wmsc/upload/file/pdf/v2/lcsc/2006151110_YAGEO-CC0201FRNPO9BN150_C541259.pdf; ComponentLink2Description: JLCPCB Part URL; ComponentLink2URL: https://jlcpcb.com/partdetail/C541259; ComponentLink3Description: LCSC Part URL; ComponentLink3URL: https://lcsc.com/product-detail/Multilayer-Ceramic-Capacitors-MLCC---SMD-SMT_YAGEO-YAGEO-CC0201FRNPO9BN150_C541259.html
footprint CAP-0201 (0201 (0603M) Capacitor)
pins: 1, 2

## CC0201FRNPO9BN330
designator C?  Capacitance: 33pF  (hidden comment: *)
Capacitor, Ceramic (MLCC), 33pF, ±1%, 50V, NP0, ±1%, SMD 0201; Manufacturer: YAGEO; Manufacturer Part Number: CC0201FRNPO9BN330; Package Size: 0201; JLCPCB Basic Part: No; JLCPCB Part Number: C541263; Supplier 1: LCSC; Category: Capacitors - MLCC; Supplier Part Number 1: C541263; Tolerance: ±1%; Voltage Rating: 50V; Temperature Coefficient: NP0; RoHS: Yes; ComponentLink1Description: Datasheet; ComponentLink1URL: https://wmsc.lcsc.com/wmsc/upload/file/pdf/v2/lcsc/2006151110_YAGEO-CC0201FRNPO9BN330_C541263.pdf; ComponentLink2Description: JLCPCB Part URL; ComponentLink2URL: https://jlcpcb.com/partdetail/C541263; ComponentLink3Description: LCSC Part URL; ComponentLink3URL: https://lcsc.com/product-detail/Multilayer-Ceramic-Capacitors-MLCC---SMD-SMT_YAGEO-YAGEO-CC0201FRNPO9BN330_C541263.html
footprint CAP-0201 (0201 (0603M) Capacitor)
pins: 1, 2

## CC0201FRNPO9BN390
designator C?  Capacitance: 39pF  (hidden comment: *)
Capacitor, Ceramic (MLCC), 39pF, ±1%, 50V, NP0, ±1%, SMD 0201; Manufacturer: YAGEO; Manufacturer Part Number: CC0201FRNPO9BN390; Package Size: 0201; JLCPCB Basic Part: No; JLCPCB Part Number: C541314; Supplier 1: LCSC; Category: Capacitors - MLCC; Supplier Part Number 1: C541314; Tolerance: ±1%; Voltage Rating: 50V; Temperature Coefficient: NP0; RoHS: Yes; ComponentLink1Description: Datasheet; ComponentLink1URL: https://wmsc.lcsc.com/wmsc/upload/file/pdf/v2/lcsc/2006151110_YAGEO-CC0201FRNPO9BN390_C541314.pdf; ComponentLink2Description: JLCPCB Part URL; ComponentLink2URL: https://jlcpcb.com/partdetail/C541314; ComponentLink3Description: LCSC Part URL; ComponentLink3URL: https://lcsc.com/product-detail/Multilayer-Ceramic-Capacitors-MLCC---SMD-SMT_YAGEO-YAGEO-CC0201FRNPO9BN390_C541314.html
footprint CAP-0201 (0201 (0603M) Capacitor)
pins: 1, 2

## CC0201FRNPO9BN470
designator C?  Capacitance: 47pF  (hidden comment: *)
Capacitor, Ceramic (MLCC), 47pF, ±1%, 50V, NP0, ±1%, SMD 0201; Manufacturer: YAGEO; Manufacturer Part Number: CC0201FRNPO9BN470; Package Size: 0201; JLCPCB Basic Part: No; JLCPCB Part Number: C1853301; Supplier 1: LCSC; Category: Capacitors - MLCC; Supplier Part Number 1: C1853301; Tolerance: ±1%; Voltage Rating: 50V; Temperature Coefficient: NP0; RoHS: Yes; ComponentLink1Description: Datasheet; ComponentLink1URL: https://wmsc.lcsc.com/wmsc/upload/file/pdf/v2/lcsc/2202151130_YAGEO-CC0201FRNPO9BN470_C1853301.pdf; ComponentLink2Description: JLCPCB Part URL; ComponentLink2URL: https://jlcpcb.com/partdetail/C1853301; ComponentLink3Description: LCSC Part URL; ComponentLink3URL: https://lcsc.com/product-detail/Multilayer-Ceramic-Capacitors-MLCC---SMD-SMT_YAGEO-YAGEO-CC0201FRNPO9BN470_C1853301.html
footprint CAP-0201 (0201 (0603M) Capacitor)
pins: 1, 2

## CC0201FRNPO9BN680
designator C?  Capacitance: 68pF  (hidden comment: *)
Capacitor, Ceramic (MLCC), 68pF, ±1%, 50V, C0G, ±1%, SMD 0201; Manufacturer: YAGEO; Manufacturer Part Number: CC0201FRNPO9BN680; Package Size: 0201; JLCPCB Basic Part: No; JLCPCB Part Number: C3833199; Supplier 1: LCSC; Category: Capacitors - MLCC; Supplier Part Number 1: C3833199; Tolerance: ±1%; Voltage Rating: 50V; Temperature Coefficient: C0G; RoHS: Yes; ComponentLink1Description: Datasheet; ComponentLink1URL: https://wmsc.lcsc.com/wmsc/upload/file/pdf/v2/lcsc/2311211121_YAGEO-CC0201FRNPO9BN680_C3833199.pdf; ComponentLink2Description: JLCPCB Part URL; ComponentLink2URL: https://jlcpcb.com/partdetail/C3833199; ComponentLink3Description: LCSC Part URL; ComponentLink3URL: https://lcsc.com/product-detail/Multilayer-Ceramic-Capacitors-MLCC---SMD-SMT_YAGEO-YAGEO-CC0201FRNPO9BN680_C3833199.html
footprint CAP-0201 (0201 (0603M) Capacitor)
pins: 1, 2

## CC0201GRNPO8BN100
designator C?  Capacitance: 10pF  (hidden comment: *)
Capacitor, Ceramic (MLCC), 10pF, ±2%, 25V, NP0, ±2%, SMD 0201; Manufacturer: YAGEO; Manufacturer Part Number: CC0201GRNPO8BN100; Package Size: 0201; JLCPCB Basic Part: No; JLCPCB Part Number: C1853527; Supplier 1: LCSC; Category: Capacitors - MLCC; Supplier Part Number 1: C1853527; Tolerance: ±2%; Voltage Rating: 25V; Temperature Coefficient: NP0; RoHS: Yes; ComponentLink1Description: Datasheet; ComponentLink1URL: https://wmsc.lcsc.com/wmsc/upload/file/pdf/v2/lcsc/2112151830_YAGEO-CC0201GRNPO8BN100_C1853527.pdf; ComponentLink2Description: JLCPCB Part URL; ComponentLink2URL: https://jlcpcb.com/partdetail/C1853527; ComponentLink3Description: LCSC Part URL; ComponentLink3URL: https://lcsc.com/product-detail/Multilayer-Ceramic-Capacitors-MLCC---SMD-SMT_YAGEO-YAGEO-CC0201GRNPO8BN100_C1853527.html
footprint CAP-0201 (0201 (0603M) Capacitor)
pins: 1, 2

## CC0201GRNPO8BN101
designator C?  Capacitance: 100pF  (hidden comment: *)
Capacitor, Ceramic (MLCC), 100pF, ±2%, 25V, NP0, ±2%, SMD 0201; Manufacturer: YAGEO; Manufacturer Part Number: CC0201GRNPO8BN101; Package Size: 0201; JLCPCB Basic Part: No; JLCPCB Part Number: C541236; Supplier 1: LCSC; Category: Capacitors - MLCC; Supplier Part Number 1: C541236; Tolerance: ±2%; Voltage Rating: 25V; Temperature Coefficient: NP0; RoHS: Yes; ComponentLink1Description: Datasheet; ComponentLink1URL: https://wmsc.lcsc.com/wmsc/upload/file/pdf/v2/lcsc/2006151110_YAGEO-CC0201GRNPO8BN101_C541236.pdf; ComponentLink2Description: JLCPCB Part URL; ComponentLink2URL: https://jlcpcb.com/partdetail/C541236; ComponentLink3Description: LCSC Part URL; ComponentLink3URL: https://lcsc.com/product-detail/Multilayer-Ceramic-Capacitors-MLCC---SMD-SMT_YAGEO-YAGEO-CC0201GRNPO8BN101_C541236.html
footprint CAP-0201 (0201 (0603M) Capacitor)
pins: 1, 2

## CC0201GRNPO8BN120
designator C?  Capacitance: 12pF  (hidden comment: *)
Capacitor, Ceramic (MLCC), 12pF, ±2%, 25V, NP0, ±2%, SMD 0201; Manufacturer: YAGEO; Manufacturer Part Number: CC0201GRNPO8BN120; Package Size: 0201; JLCPCB Basic Part: No; JLCPCB Part Number: C541237; Supplier 1: LCSC; Category: Capacitors - MLCC; Supplier Part Number 1: C541237; Tolerance: ±2%; Voltage Rating: 25V; Temperature Coefficient: NP0; RoHS: Yes; ComponentLink1Description: Datasheet; ComponentLink1URL: https://wmsc.lcsc.com/wmsc/upload/file/pdf/v2/lcsc/2006151110_YAGEO-CC0201GRNPO8BN120_C541237.pdf; ComponentLink2Description: JLCPCB Part URL; ComponentLink2URL: https://jlcpcb.com/partdetail/C541237; ComponentLink3Description: LCSC Part URL; ComponentLink3URL: https://lcsc.com/product-detail/Multilayer-Ceramic-Capacitors-MLCC---SMD-SMT_YAGEO-YAGEO-CC0201GRNPO8BN120_C541237.html
footprint CAP-0201 (0201 (0603M) Capacitor)
pins: 1, 2

## CC0201GRNPO9BN101
designator C?  Capacitance: 100pF  (hidden comment: *)
Capacitor, Ceramic (MLCC), 100pF, ±2%, 50V, NP0, ±2%, SMD 0201; Manufacturer: YAGEO; Manufacturer Part Number: CC0201GRNPO9BN101; Package Size: 0201; JLCPCB Basic Part: No; JLCPCB Part Number: C541242; Supplier 1: LCSC; Category: Capacitors - MLCC; Supplier Part Number 1: C541242; Tolerance: ±2%; Voltage Rating: 50V; Temperature Coefficient: NP0; RoHS: Yes; ComponentLink1Description: Datasheet; ComponentLink1URL: https://wmsc.lcsc.com/wmsc/upload/file/pdf/v2/lcsc/2006151110_YAGEO-CC0201GRNPO9BN101_C541242.pdf; ComponentLink2Description: JLCPCB Part URL; ComponentLink2URL: https://jlcpcb.com/partdetail/C541242; ComponentLink3Description: LCSC Part URL; ComponentLink3URL: https://lcsc.com/product-detail/Multilayer-Ceramic-Capacitors-MLCC---SMD-SMT_YAGEO-YAGEO-CC0201GRNPO9BN101_C541242.html
footprint CAP-0201 (0201 (0603M) Capacitor)
pins: 1, 2

## CC0201GRNPO9BN180
designator C?  Capacitance: 18pF  (hidden comment: *)
Capacitor, Ceramic (MLCC), 18pF, ±2%, 50V, NP0, ±2%, SMD 0201; Manufacturer: YAGEO; Manufacturer Part Number: CC0201GRNPO9BN180; Package Size: 0201; JLCPCB Basic Part: No; JLCPCB Part Number: C541245; Supplier 1: LCSC; Category: Capacitors - MLCC; Supplier Part Number 1: C541245; Tolerance: ±2%; Voltage Rating: 50V; Temperature Coefficient: NP0; RoHS: Yes; ComponentLink1Description: Datasheet; ComponentLink1URL: https://wmsc.lcsc.com/wmsc/upload/file/pdf/v2/lcsc/2006151110_YAGEO-CC0201GRNPO9BN180_C541245.pdf; ComponentLink2Description: JLCPCB Part URL; ComponentLink2URL: https://jlcpcb.com/partdetail/C541245; ComponentLink3Description: LCSC Part URL; ComponentLink3URL: https://lcsc.com/product-detail/Multilayer-Ceramic-Capacitors-MLCC---SMD-SMT_YAGEO-YAGEO-CC0201GRNPO9BN180_C541245.html
footprint CAP-0201 (0201 (0603M) Capacitor)
pins: 1, 2

## CC0201GRNPO9BN220
designator C?  Capacitance: 22pF  (hidden comment: *)
Capacitor, Ceramic (MLCC), 22pF, ±2%, 50V, NP0, ±2%, SMD 0201; Manufacturer: YAGEO; Manufacturer Part Number: CC0201GRNPO9BN220; Package Size: 0201; JLCPCB Basic Part: No; JLCPCB Part Number: C526932; Supplier 1: LCSC; Category: Capacitors - MLCC; Supplier Part Number 1: C526932; Tolerance: ±2%; Voltage Rating: 50V; Temperature Coefficient: NP0; RoHS: Yes; ComponentLink1Description: Datasheet; ComponentLink1URL: https://wmsc.lcsc.com/wmsc/upload/file/pdf/v2/lcsc/2005222137_YAGEO-CC0201GRNPO9BN220_C526932.pdf; ComponentLink2Description: JLCPCB Part URL; ComponentLink2URL: https://jlcpcb.com/partdetail/C526932; ComponentLink3Description: LCSC Part URL; ComponentLink3URL: https://lcsc.com/product-detail/Multilayer-Ceramic-Capacitors-MLCC---SMD-SMT_YAGEO-YAGEO-CC0201GRNPO9BN220_C526932.html
footprint CAP-0201 (0201 (0603M) Capacitor)
pins: 1, 2

## CC0201GRNPO9BN470
designator C?  Capacitance: 47pF  (hidden comment: *)
Capacitor, Ceramic (MLCC), 47pF, ±2%, 50V, NP0, ±2%, SMD 0201; Manufacturer: YAGEO; Manufacturer Part Number: CC0201GRNPO9BN470; Package Size: 0201; JLCPCB Basic Part: No; JLCPCB Part Number: C541249; Supplier 1: LCSC; Category: Capacitors - MLCC; Supplier Part Number 1: C541249; Tolerance: ±2%; Voltage Rating: 50V; Temperature Coefficient: NP0; RoHS: Yes; ComponentLink1Description: Datasheet; ComponentLink1URL: https://wmsc.lcsc.com/wmsc/upload/file/pdf/v2/lcsc/2006151110_YAGEO-CC0201GRNPO9BN470_C541249.pdf; ComponentLink2Description: JLCPCB Part URL; ComponentLink2URL: https://jlcpcb.com/partdetail/C541249; ComponentLink3Description: LCSC Part URL; ComponentLink3URL: https://lcsc.com/product-detail/Multilayer-Ceramic-Capacitors-MLCC---SMD-SMT_YAGEO-YAGEO-CC0201GRNPO9BN470_C541249.html
footprint CAP-0201 (0201 (0603M) Capacitor)
pins: 1, 2

## CC0201JRNPO8BN120
designator C?  Capacitance: 12pF  (hidden comment: *)
Capacitor, Ceramic (MLCC), 12pF, ±5%, 25V, NP0, ±5%, SMD 0201; Manufacturer: YAGEO; Manufacturer Part Number: CC0201JRNPO8BN120; Package Size: 0201; JLCPCB Basic Part: No; JLCPCB Part Number: C277486; Supplier 1: LCSC; Category: Capacitors - MLCC; Supplier Part Number 1: C277486; Tolerance: ±5%; Voltage Rating: 25V; Temperature Coefficient: NP0; RoHS: Yes; ComponentLink1Description: Datasheet; ComponentLink1URL: https://wmsc.lcsc.com/wmsc/upload/file/pdf/v2/lcsc/2304140030_YAGEO-CC0201JRNPO8BN120_C277486.pdf; ComponentLink2Description: JLCPCB Part URL; ComponentLink2URL: https://jlcpcb.com/partdetail/C277486; ComponentLink3Description: LCSC Part URL; ComponentLink3URL: https://lcsc.com/product-detail/Multilayer-Ceramic-Capacitors-MLCC---SMD-SMT_YAGEO-YAGEO-CC0201JRNPO8BN120_C277486.html
footprint CAP-0201 (0201 (0603M) Capacitor)
pins: 1, 2

## CC0201JRNPO8BN180
designator C?  Capacitance: 18pF  (hidden comment: *)
Capacitor, Ceramic (MLCC), 18pF, ±5%, 25V, NP0, ±5%, SMD 0201; Manufacturer: YAGEO; Manufacturer Part Number: CC0201JRNPO8BN180; Package Size: 0201; JLCPCB Basic Part: No; JLCPCB Part Number: C513686; Supplier 1: LCSC; Category: Capacitors - MLCC; Supplier Part Number 1: C513686; Tolerance: ±5%; Voltage Rating: 25V; Temperature Coefficient: NP0; RoHS: Yes; ComponentLink1Description: Datasheet; ComponentLink1URL: https://wmsc.lcsc.com/wmsc/upload/file/pdf/v2/lcsc/2004231434_YAGEO-CC0201JRNPO8BN180_C513686.pdf; ComponentLink2Description: JLCPCB Part URL; ComponentLink2URL: https://jlcpcb.com/partdetail/C513686; ComponentLink3Description: LCSC Part URL; ComponentLink3URL: https://lcsc.com/product-detail/Multilayer-Ceramic-Capacitors-MLCC---SMD-SMT_YAGEO-YAGEO-CC0201JRNPO8BN180_C513686.html
footprint CAP-0201 (0201 (0603M) Capacitor)
pins: 1, 2

## CC0201JRNPO8BN200
designator C?  Capacitance: 20pF  (hidden comment: *)
Capacitor, Ceramic (MLCC), 20pF, ±5%, 25V, NP0, ±5%, SMD 0201; Manufacturer: YAGEO; Manufacturer Part Number: CC0201JRNPO8BN200; Package Size: 0201; JLCPCB Basic Part: No; JLCPCB Part Number: C541204; Supplier 1: LCSC; Category: Capacitors - MLCC; Supplier Part Number 1: C541204; Tolerance: ±5%; Voltage Rating: 25V; Temperature Coefficient: NP0; RoHS: Yes; ComponentLink1Description: Datasheet; ComponentLink1URL: https://wmsc.lcsc.com/wmsc/upload/file/pdf/v2/lcsc/2006151109_YAGEO-CC0201JRNPO8BN200_C541204.pdf; ComponentLink2Description: JLCPCB Part URL; ComponentLink2URL: https://jlcpcb.com/partdetail/C541204; ComponentLink3Description: LCSC Part URL; ComponentLink3URL: https://lcsc.com/product-detail/Multilayer-Ceramic-Capacitors-MLCC---SMD-SMT_YAGEO-YAGEO-CC0201JRNPO8BN200_C541204.html
footprint CAP-0201 (0201 (0603M) Capacitor)
pins: 1, 2
